# Altium footprint library lib_eps.PcbLib: 113 footprints (part 1 of 8)
Each footprint in its own frame and in the unit in brackets; x right, y up, seen from the top. Pads: shape width x height; smd on the part's side, far side on the other; paste and mask are expansions set on the pad; w line width, h text height; cw(c..) or ccw(c..) is an arc to the next point about the centre after c.
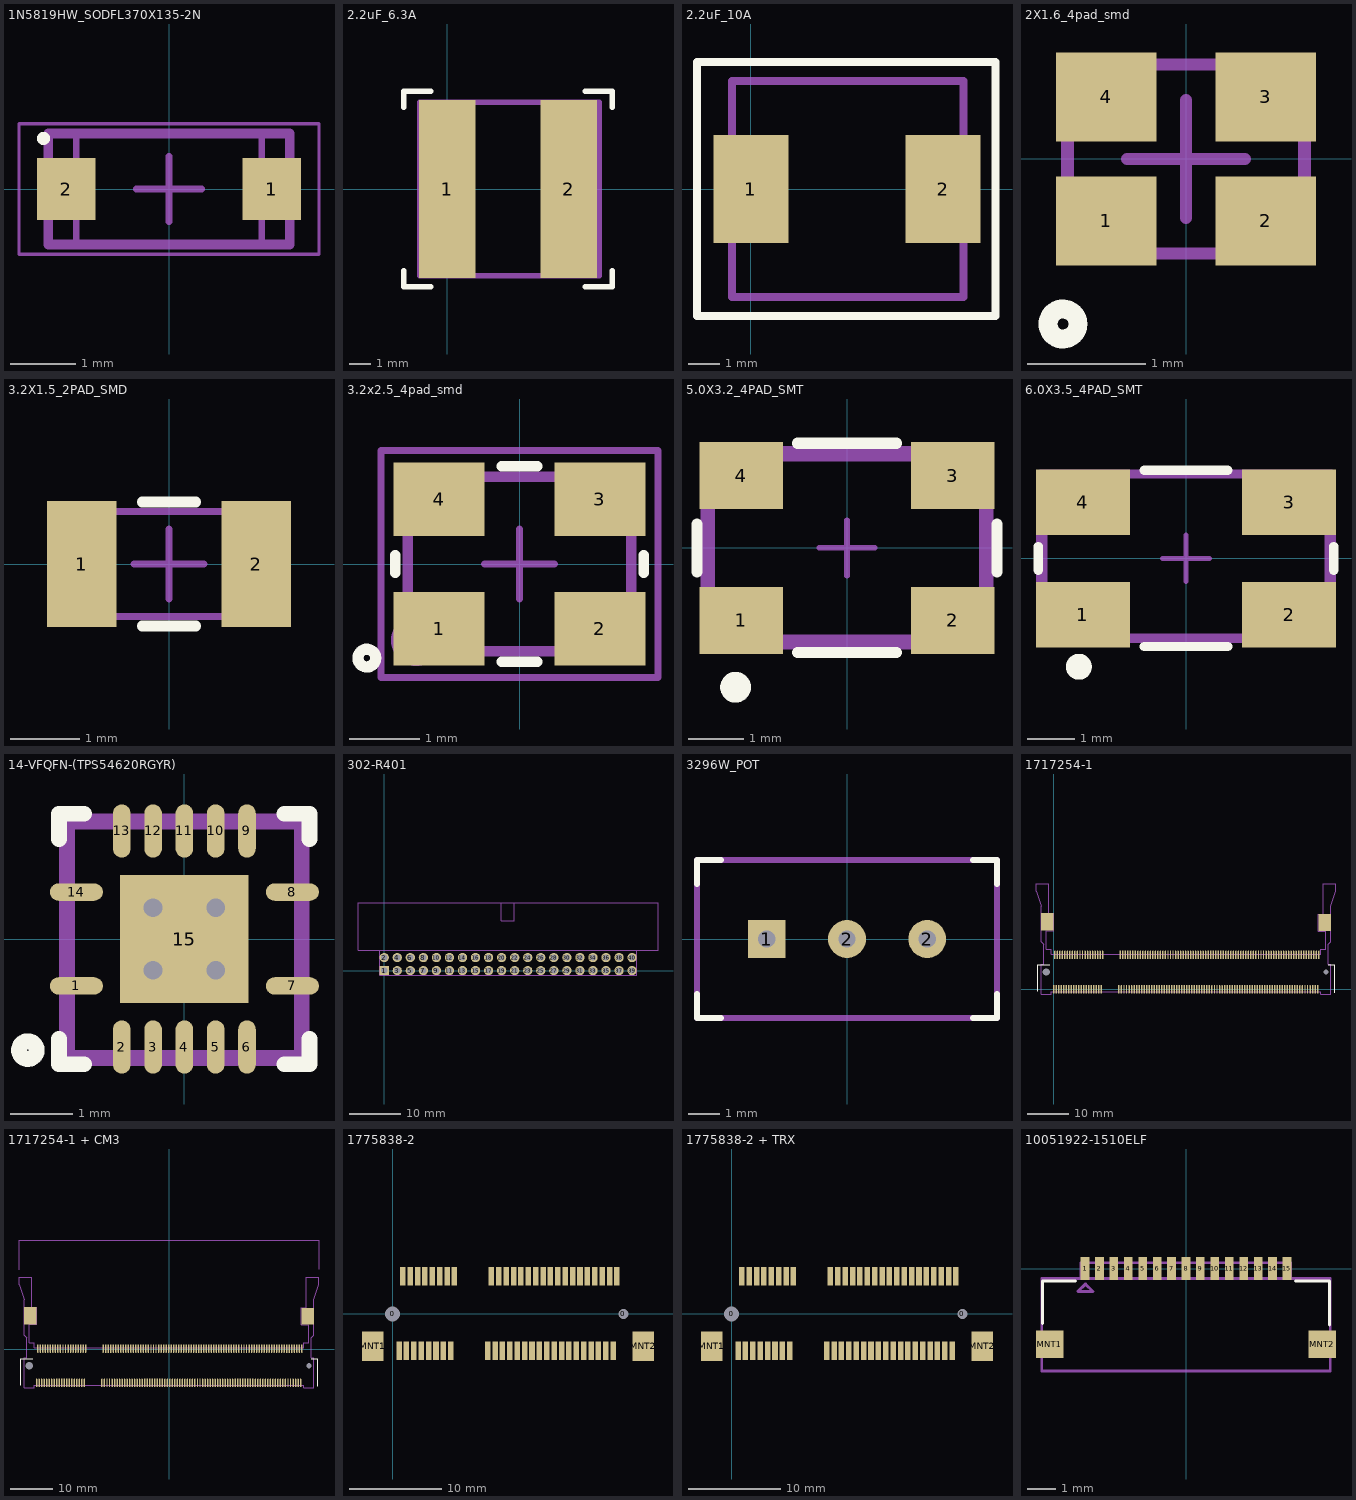
[diagram p0: the footprints below, top view; thin cyan lines are the x and y axes]

## 1N5819HW_SODFL370X135-2N [mm] "SODFL, 2-Leads, Body 1,55x3,70mm, IPC Medium Density"
height 1.35
pads (2):
  rect 0.9x0.95 smd: 1(1.575,0) 2(-1.575,0)
Top Overlay:
  circle w0.1: c-1.925,0.775 r0.05
Mechanical 13:
  lines w0.1: -1.425,-0.85 1.425,-0.85 1.425,0.85 -1.425,0.85 -1.425,-0.85
Mechanical 15:
  lines w0.05: -2.3,-1 2.3,-1 2.3,1 -2.3,1 -2.3,-1
  lines w0.1: -0.5,0 0.5,0 ; 0,-0.5 0,0.5
Mechanical 29:
  lines w0.15: -1.85,-0.85 1.85,-0.85 1.85,0.85 -1.85,0.85 -1.85,-0.85
  text "'.Designator'" at -1.575,-0.25 h0.6
3D body "1N5819HW_SODFL370X135-2N.step": height 1.35, standoff 0, extent -1.85,-0.85 1.85,0.85

## 2.2uF_6.3A [mm] "0.315\" L x 0.315\" W (8.00mm x 8.00mm) 6.3A"
pads (2):
  rect 2.6x8.2 smd paste-5: 1(0,0) 2(5.6,0)
Top Overlay:
  lines w0.254: -2,-3.75 -2,-4 -2,-4.5 -0.75,-4.5 ; -2,3.75 -2,4.5 -0.75,4.5 ; 6.35,-4.5 7.6,-4.5 7.6,-3.75 ; 6.35,4.5 7.6,4.5 7.6,3.75
Top Paste:
  region: 5.8,-2.425 6.8,-2.425 6.8,-4 5.8,-4
  region: 4.4,-2.425 5.4,-2.425 5.4,-4 4.4,-4
  region: 5.8,-0.2 6.8,-0.2 6.8,-1.925 5.8,-1.925
  region: 4.4,-0.2 5.4,-0.2 5.4,-1.925 4.4,-1.925
  region: 5.8,1.925 6.8,1.925 6.8,0.2 5.8,0.2
  region: 4.4,1.925 5.4,1.925 5.4,0.2 4.4,0.2
  region: 5.8,4 6.8,4 6.8,2.425 5.8,2.425
  region: 4.4,4 5.4,4 5.4,2.425 4.4,2.425
  region: -1.2,4 -0.2,4 -0.2,2.425 -1.2,2.425
  region: 0.2,4 1.2,4 1.2,2.425 0.2,2.425
  region: -1.2,1.925 -0.2,1.925 -0.2,0.2 -1.2,0.2
  region: 0.2,1.925 1.2,1.925 1.2,0.2 0.2,0.2
  region: -1.2,-0.2 -0.2,-0.2 -0.2,-1.925 -1.2,-1.925
  region: 0.2,-0.2 1.2,-0.2 1.2,-1.925 0.2,-1.925
  region: -1.2,-2.425 -0.2,-2.425 -0.2,-4 -1.2,-4
  region: 0.2,-2.425 1.2,-2.425 1.2,-4 0.2,-4
Mechanical 29:
  lines w0.254: -1.25,-4 -1.25,4 2,4 7,4 7,-4 -1.25,-4
  text "'.Designator'" at -0.3,-0.5 h1.52
3D body "srn8040.stp": height 4, standoff 0.05, extent -1.275,-3.95 6.875,3.95

## 2.2uF_10A [mm] "0.283\" L x 0.262\" W (7.20mm x 6.65mm) 2.2UH 8A"
pads (2):
  rect 2.35x3.4 smd: 1(0,0) 2(6.05,0)
Top Overlay:
  lines w0.254: -1.7,-4 -1.7,0.5 -1.7,4 7.7,4 7.7,-4 -1.7,-4
Mechanical 29:
  lines w0.254: -0.6,-3.4 -0.6,1.9 -0.6,3.4 6.7,3.4 6.7,-3.4 -0.6,-3.4
  text "'.Designator'" at 0.4,-0.7 h1.52
3D body "ASPI-0630LR.STEP": height 1.35, standoff -1.65, extent -0.575,-3.325 6.625,3.325

## 2X1.6_4pad_smd [mm] "2x1.6mm 4Pad SMD"
pads (4):
  rect 0.85x0.75 smd paste+0: 1(-0.675,-0.525) 2(0.675,-0.525) 3(0.675,0.525) 4(-0.675,0.525)
Top Overlay:
  circle w0.16: c-1.041,-1.397 r0.127
Mechanical 13:
  lines w0.1: -1.009,-0.575 -1,-0.584 cw(c-1.003,-0.8) -0.787,-0.8 0.797,-0.8 cw(c1.013,-0.8) 1.009,-0.584 1.009,0.575 1,0.584 cw(c1.003,0.8) 0.787,0.8 -0.797,0.8 cw(c-1.013,0.8) -1.009,0.584 -1.009,-0.575
Mechanical 15:
  lines w0.1: -0.5,0 0.5,0 ; 0,-0.5 0,0.5
Mechanical 29:
  circle w0.15: c-0.61,-0.406 r0.17
  lines w0.1: -1,-0.8 -1,0.8 1,0.8 1,-0.8 -1,-0.8
  text ".Designator" at -0.8,-0.1 h0.6
3D body: height 0.45, standoff 0.05, extent -0.999,-0.799 0.999,0.799

## 3.2X1.5_2PAD_SMD [mm]
pads (2):
  rect 1x1.8 smd: 1(-1.25,0) 2(1.25,0)
Top Overlay:
  lines w0.152: -0.381,-0.889 0.381,-0.889 ; -0.381,0.889 0.381,0.889
Mechanical 13:
  lines w0.1: -1.601,-0.749 -1.601,0.751 1.599,0.751 1.599,-0.749 -1.601,-0.749
Mechanical 15:
  lines w0.1: -0.5,0 0.5,0 ; 0,-0.5 0,0.5
Mechanical 29:
  lines w0.1: -1.6,-0.75 1.6,-0.75 1.6,0.75 -1.6,0.75 -1.6,-0.75
  text ".Designator" at -1.295,-0.432 h0.8
3D body "ABS07-120.STEP": height 0.89, standoff 0, extent -1.603,-0.752 1.603,0.752

## 3.2x2.5_4pad_smd [mm] "3.2x2.5mm 4Pad SMD"
pads (4):
  rect 1.3x1.05 smd paste+0: 1(-1.15,-0.925) 2(1.15,-0.925) 3(1.15,0.925) 4(-1.15,0.925)
Top Overlay:
  circle w0.16: c-2.184,-1.346 r0.127
  lines w0.15: -1.778,-0.127 -1.778,0.127 ; -0.254,-1.397 0.254,-1.397 ; -0.254,1.397 0.254,1.397 ; 1.778,-0.127 1.778,0.127
Mechanical 13:
  lines w0.15: -1.6,-1.25 1.6,-1.25 1.6,1.25 -1.6,1.25 -1.6,-1.25
Mechanical 15:
  lines w0.05: -1.981,-1.626 -1.981,1.626 1.981,1.626 1.981,-1.626 -1.981,-1.626
  lines w0.1: -0.5,0 0.5,0 ; 0,-0.5 0,0.5
Mechanical 29:
  circle w0.254: c-1.473,-1.092 r0.24
  lines w0.1: -1.981,-1.626 1.981,-1.626 1.981,1.626 -1.981,1.626 -1.981,-1.626
  text ".Designator" at -1.651,-0.152 h0.8
3D body "ABM8.STEP": height 0.8, standoff 0, extent -1.6,-1.244 1.6,1.245

## 5.0X3.2_4PAD_SMT [mm] "5.0mm x 3.2mm Oscillator"
pads (4):
  rect 1.5x1.2 smd paste+0: 1(-1.9,-1.3) 2(1.9,-1.3) 3(1.9,1.3) 4(-1.9,1.3)
Top Overlay:
  circle w0.3: c-2,-2.5 r0.127
  lines w0.2: -2.692,-0.432 -2.692,0.432 ; -0.889,-1.88 0.889,-1.88 ; -0.889,1.88 0.889,1.88 ; 2.692,-0.432 2.692,0.432
Mechanical 13:
  lines w0.1: -2.5,-1.6 -2.5,1.6 2.5,1.6 2.5,-1.6 -2.5,-1.6
Mechanical 15:
  lines w0.1: -0.5,0 0.5,0 ; 0,-0.5 0,0.5
Mechanical 29:
  lines w0.18: -1.588,-1.029 ccw(c-1.8,-1.1) -1.576,-1.1
  lines w0.254: -2.5,-1.7 -2.5,-0.5 -2.5,0.6 -2.5,1.7 2.5,1.7 2.5,-1.7 -2.5,-1.7
  text "'.Designator'" at -1.8,-0.6 h1.52
3D body: height 1.5, standoff 0.05, extent -2.55,-1.65 2.55,1.65

## 6.0X3.5_4PAD_SMT [mm] "6.0mm x 3.5mm Oscillator"
pads (4):
  rect 2x1.4 smd paste+0: 1(-2.2,-1.2) 2(2.2,-1.2) 3(2.2,1.2) 4(-2.2,1.2)
Top Overlay:
  circle w0.3: c-2.286,-2.311 r0.127
  lines w0.2: -3.15,-0.254 -3.15,0.254 ; -0.889,-1.88 0.889,-1.88 ; -0.889,1.88 0.889,1.88 ; 3.15,-0.254 3.15,0.254
Mechanical 13:
  lines w0.1: -3,-1.75 -3,1.75 3,1.75 3,-1.75 -3,-1.75
Mechanical 15:
  lines w0.1: -0.5,0 0.5,0 ; 0,-0.5 0,0.5
Mechanical 29:
  circle w0.18: c-2.4,-1.1 r0.283
  lines w0.2: -3.1,-0.3 -3.1,1.8 3.1,1.8 3.1,-1.7 -3.1,-1.7 -3.1,0
  text "'.Designator'" at -2.7,-0.3 h1.52
3D body: height 1.1, standoff 0.05, extent -2.999,-1.749 2.999,1.749

## 14-VFQFN-(TPS54620RGYR) [mm]
pads (15):
  oval 0.85x0.28 smd mask+0.051: 1(-1.725,-0.75) 7(1.725,-0.75) 8(1.725,0.75) 14(-1.725,0.75)
  oval 0.28x0.85 smd mask+0.051: 2(-1,-1.725) 3(-0.5,-1.725) 4(0,-1.725) 5(0.5,-1.725) 6(1,-1.725) 9(1,1.725) 10(0.5,1.725) 11(0,1.725) 12(-0.5,1.725) 13(-1,1.725)
  rect 2.05x2.05 smd mask+0.051: 15(0,0)
via 0.5,0.5 diameter 0.605 hole 0.3
via -0.5,0.5 diameter 0.605 hole 0.3
via -0.5,-0.5 diameter 0.605 hole 0.3
via 0.5,-0.5 diameter 0.605 hole 0.3
Top Overlay:
  circle w0.254: c-2.5,-1.775 r0.141
  lines w0.254: -2,-1.6 -2,-2 -1.6,-2 ; -2,1.6 -2,2 -1.6,2 ; 1.6,-2 2,-2 2,-1.6 ; 1.6,2 2,2 2,1.6
Mechanical 29:
  lines w0.254: -1.875,-1.9 1.85,-1.9 1.875,-1.875 1.875,-0.025 1.875,1.875 -1.875,1.875 -1.875,-1.9
  text "'.Designator'" at -1.35,-0.625 h1.52
3D body "RGY14_2P05X2P05.step": height 1, standoff 0, extent -1.876,-1.876 1.876,1.876

## 302-R401 [mm] "CONN HEADER R/A 40POS 2.54MM"
height 0.231
pads (40):
  rect 1.8x1.8 hole 1.2: 1(0,0)
  round 1.8 hole 1.2: 2(0,2.54) 3(2.54,0) 4(2.54,2.54) 5(5.08,0) 6(5.08,2.54) 7(7.62,0) 8(7.62,2.54) 9(10.16,0) 10(10.16,2.54) 11(12.7,0) 12(12.7,2.54) 13(15.24,0) 14(15.24,2.54) 15(17.78,0) 16(17.78,2.54) 17(20.32,0) 18(20.32,2.54) 19(22.86,0) 20(22.86,2.54) 21(25.4,0) 22(25.4,2.54) 23(27.94,0) 24(27.94,2.54) 25(30.48,0) 26(30.48,2.54) 27(33.02,0) 28(33.02,2.54) 29(35.56,0) 30(35.56,2.54) 31(38.1,0) 32(38.1,2.54) 33(40.64,0) 34(40.64,2.54) 35(43.18,0) 36(43.18,2.54) 37(45.72,0) 38(45.72,2.54) 39(48.26,0) 40(48.26,2.54)
Mechanical 29:
  lines w0.1: 22.8,13.2 22.8,9.7 25.3,9.7 25.3,13.2 ; -0.9,4 -0.9,-0.9 49.2,-0.9 49.2,4 ; -0.9,4 -5.1,4 -5.1,13.2 53.3,13.2 53.3,4 49.2,4 ; -0.9,4 49.2,4
  text "'.Designator'" at 21,5.8 h2.5
3D body "BH-40R.STEP": height 8.6, standoff -3.3, extent -5.06,-0.35 53.34,13.21

## 3296W_POT [mm] "Rectangular - 0.375\" x 0.190\" Face x 0.395\" H (9.53mm x 4.83mm x 10.03mm)"
pads (3):
  rect 1.2x1.2 hole 0.55: 1(-2.54,0)
  round 1.2 hole 0.55: 2(0,0) 2(2.54,0)
Top Overlay:
  lines w0.2: -4.75,-1.75 -4.75,-2.5 -4,-2.5 ; -4.75,1.75 -4.75,2.5 -4,2.5 ; 4,-2.5 4.75,-2.5 4.75,-1.75 ; 4,2.5 4.75,2.5 4.75,1.75
Mechanical 29:
  lines w0.2: -4.75,-2.5 4.75,-2.5 4.75,2.5 -4.75,2.5 -4.75,-2.5
  text "'.Designator'" at -3.25,-1.75 h0.6
3D body "3296W.stp": height 11.52, standoff -6.43, extent -4.762,-2.425 4.763,2.401

## 1717254-1 [mm] "CONN SKT SODIMM 200POS R/A SMD"
height 5.2
pads (204):
  rrect50% 0x0 hole 1.7 mask+0.052: 0(-1.75,4.1)
  rrect50% 0.35x2 smd mask+0.052: 1(0,0) 2(0.3,8.2) 3(0.6,0) 4(0.9,8.2) 5(1.2,0) 6(1.5,8.2) 7(1.8,0) 8(2.1,8.2) 9(2.4,0) 10(2.7,8.2) 11(3,0) 12(3.3,8.2) 13(3.6,0) 14(3.9,8.2) 15(4.2,0) 16(4.5,8.2) 17(4.8,0) 18(5.1,8.2) 19(5.4,0) 20(5.7,8.2) 21(6,0) 22(6.3,8.2) 23(6.6,0) 24(6.9,8.2) 25(7.2,0) 26(7.5,8.2) 27(7.8,0) 28(8.1,8.2) 29(8.4,0) 30(8.7,8.2) 31(9,0) 32(9.3,8.2) 33(9.6,0) 34(9.9,8.2) 35(10.2,0) 36(10.5,8.2) 37(10.8,0) 38(11.1,8.2) 39(11.4,0) 40(11.7,8.2) 41(15.6,0) 42(15.9,8.2) 43(16.2,0) 44(16.5,8.2) 45(16.8,0) 46(17.1,8.2) 47(17.4,0) 48(17.7,8.2) 49(18,0) 50(18.3,8.2) 51(18.6,0) 52(18.9,8.2) 53(19.2,0) 54(19.5,8.2) 55(19.8,0) 56(20.1,8.2) 57(20.4,0) 58(20.7,8.2) 59(21,0) 60(21.3,8.2) 61(21.6,0) 62(21.9,8.2) 63(22.2,0) 64(22.5,8.2) 65(22.8,0) 66(23.1,8.2) 67(23.4,0) 68(23.7,8.2) 69(24,0) 70(24.3,8.2) 71(24.6,0) 72(24.9,8.2) 73(25.2,0) 74(25.5,8.2) 75(25.8,0) 76(26.1,8.2) 77(26.4,0) 78(26.7,8.2) 79(27,0) 80(27.3,8.2) 81(27.6,0) 82(27.9,8.2) 83(28.2,0) 84(28.5,8.2) 85(28.8,0) 86(29.1,8.2) 87(29.4,0) 88(29.7,8.2) 89(30,0) 90(30.3,8.2) 91(30.6,0) 92(30.9,8.2) 93(31.2,0) 94(31.5,8.2) 95(31.8,0) 96(32.1,8.2) 97(32.4,0) 98(32.7,8.2) 99(33,0) 100(33.3,8.2) 101(33.6,0) 102(33.9,8.2) 103(34.2,0) 104(34.5,8.2) 105(34.8,0) 106(35.1,8.2) 107(35.4,0) 108(35.7,8.2) 109(36,0) 110(36.3,8.2) 111(36.6,0) 112(36.9,8.2) 113(37.2,0) 114(37.5,8.2) 115(37.8,0) 116(38.1,8.2) 117(38.4,0) 118(38.7,8.2) 119(39,0) 120(39.3,8.2) 121(39.6,0) 122(39.9,8.2) 123(40.2,0) 124(40.5,8.2) 125(40.8,0) 126(41.1,8.2) 127(41.4,0) 128(41.7,8.2) 129(42,0) 130(42.3,8.2) 131(42.6,0) 132(42.9,8.2) 133(43.2,0) 134(43.5,8.2) 135(43.8,0) 136(44.1,8.2) 137(44.4,0) 138(44.7,8.2) 139(45,0) 140(45.3,8.2) 141(45.6,0) 142(45.9,8.2) 143(46.2,0) 144(46.5,8.2) 145(46.8,0) 146(47.1,8.2) 147(47.4,0) 148(47.7,8.2) 149(48,0) 150(48.3,8.2) 151(48.6,0) 152(48.9,8.2) 153(49.2,0) 154(49.5,8.2) 155(49.8,0) 156(50.1,8.2) 157(50.4,0) 158(50.7,8.2) 159(51,0) 160(51.3,8.2) 161(51.6,0) 162(51.9,8.2) 163(52.2,0) 164(52.5,8.2) 165(52.8,0) 166(53.1,8.2) 167(53.4,0) 168(53.7,8.2) 169(54,0) 170(54.3,8.2) 171(54.6,0) 172(54.9,8.2) 173(55.2,0) 174(55.5,8.2) 175(55.8,0) 176(56.1,8.2) 177(56.4,0) 178(56.7,8.2) 179(57,0) 180(57.3,8.2) 181(57.6,0) 182(57.9,8.2) 183(58.2,0) 184(58.5,8.2) 185(58.8,0) 186(59.1,8.2) 187(59.4,0) 188(59.7,8.2) 189(60,0) 190(60.3,8.2) 191(60.6,0) 192(60.9,8.2) 193(61.2,0) 194(61.5,8.2) 195(61.8,0) 196(62.1,8.2) 197(62.4,0) 198(62.7,8.2) 199(63,0) 200(63.3,8.2)
  rrect50% 0x0 hole 1.2 mask+0.052: 1(65.05,4.1)
  rect 3x4.2 smd mask+0.052: PAD1(-1.525,16.075)
  rect 3x4 smd mask+0.052: PAD2(64.75,15.925)
Top Overlay:
  lines w0.1: -3.8,-0.5 -3.8,5.8 -0.9,5.8 ; 65.6,5.8 67.1,5.8 67.1,-0.8
Mechanical 29:
  lines w0.1: -4.2,23.4 -4.2,25.2 -1.2,25.2 -1.2,18.1 0,18.1 0,14 -1.8,14 -1.8,9.6 -0.6,9.6 -0.6,8.4 63.8,8.4 63.8,9.6 65,9.6 65,13.9 63.2,13.9 63.2,17.9 64.4,17.9 64.4,25.2 67.4,25.2 67.4,23.4 66.2,19.8 66.2,11.4 65.6,10.8 65.6,6 66.2,6 66.2,-1.2 63.8,-1.2 63.8,-0.6 63.2,-0.6 0,-0.6 -0.6,-0.6 -0.6,-1.2 -3,-1.2 -3,6 -2.4,6 -2.4,10.8 -3,11.4 -3,19.8 -4.2,23.4
  text "'.Designator'" at 25.3,2.8 h2.5
3D body "c-1717254-1-d1-3d.stp": height 5.48, standoff -0.42, extent -4.1,-0.9 67.4,25.14

## 1717254-1 + CM3 [mm] "CONN SKT SODIMM 200POS R/A SMD"
height 5.2
pads (204):
  rrect50% 0x0 hole 1.7 mask+0.052: 0(-33.4,-3.938)
  rrect50% 0.35x2 smd mask+0.052: 1(-31.65,-8.038) 2(-31.35,0.162) 3(-31.05,-8.038) 4(-30.75,0.162) 5(-30.45,-8.038) 6(-30.15,0.162) 7(-29.85,-8.038) 8(-29.55,0.162) 9(-29.25,-8.038) 10(-28.95,0.162) 11(-28.65,-8.038) 12(-28.35,0.162) 13(-28.05,-8.038) 14(-27.75,0.162) 15(-27.45,-8.038) 16(-27.15,0.162) 17(-26.85,-8.038) 18(-26.55,0.162) 19(-26.25,-8.038) 20(-25.95,0.162) 21(-25.65,-8.038) 22(-25.35,0.162) 23(-25.05,-8.038) 24(-24.75,0.162) 25(-24.45,-8.038) 26(-24.15,0.162) 27(-23.85,-8.038) 28(-23.55,0.162) 29(-23.25,-8.038) 30(-22.95,0.162) 31(-22.65,-8.038) 32(-22.35,0.162) 33(-22.05,-8.038) 34(-21.75,0.162) 35(-21.45,-8.038) 36(-21.15,0.162) 37(-20.85,-8.038) 38(-20.55,0.162) 39(-20.25,-8.038) 40(-19.95,0.162) 41(-16.05,-8.038) 42(-15.75,0.162) 43(-15.45,-8.038) 44(-15.15,0.162) 45(-14.85,-8.038) 46(-14.55,0.162) 47(-14.25,-8.038) 48(-13.95,0.162) 49(-13.65,-8.038) 50(-13.35,0.162) 51(-13.05,-8.038) 52(-12.75,0.162) 53(-12.45,-8.038) 54(-12.15,0.162) 55(-11.85,-8.038) 56(-11.55,0.162) 57(-11.25,-8.038) 58(-10.95,0.162) 59(-10.65,-8.038) 60(-10.35,0.162) 61(-10.05,-8.038) 62(-9.75,0.162) 63(-9.45,-8.038) 64(-9.15,0.162) 65(-8.85,-8.038) 66(-8.55,0.162) 67(-8.25,-8.038) 68(-7.95,0.162) 69(-7.65,-8.038) 70(-7.35,0.162) 71(-7.05,-8.038) 72(-6.75,0.162) 73(-6.45,-8.038) 74(-6.15,0.162) 75(-5.85,-8.038) 76(-5.55,0.162) 77(-5.25,-8.038) 78(-4.95,0.162) 79(-4.65,-8.038) 80(-4.35,0.162) 81(-4.05,-8.038) 82(-3.75,0.162) 83(-3.45,-8.038) 84(-3.15,0.162) 85(-2.85,-8.038) 86(-2.55,0.162) 87(-2.25,-8.038) 88(-1.95,0.162) 89(-1.65,-8.038) 90(-1.35,0.162) 91(-1.05,-8.038) 92(-0.75,0.162) 93(-0.45,-8.038) 94(-0.15,0.162) 95(0.15,-8.038) 96(0.45,0.162) 97(0.75,-8.038) 98(1.05,0.162) 99(1.35,-8.038) 100(1.65,0.162) 101(1.95,-8.038) 102(2.25,0.162) 103(2.55,-8.038) 104(2.85,0.162) 105(3.15,-8.038) 106(3.45,0.162) 107(3.75,-8.038) 108(4.05,0.162) 109(4.35,-8.038) 110(4.65,0.162) 111(4.95,-8.038) 112(5.25,0.162) 113(5.55,-8.038) 114(5.85,0.162) 115(6.15,-8.038) 116(6.45,0.162) 117(6.75,-8.038) 118(7.05,0.162) 119(7.35,-8.038) 120(7.65,0.162) 121(7.95,-8.038) 122(8.25,0.162) 123(8.55,-8.038) 124(8.85,0.162) 125(9.15,-8.038) 126(9.45,0.162) 127(9.75,-8.038) 128(10.05,0.162) 129(10.35,-8.038) 130(10.65,0.162) 131(10.95,-8.038) 132(11.25,0.162) 133(11.55,-8.038) 134(11.85,0.162) 135(12.15,-8.038) 136(12.45,0.162) 137(12.75,-8.038) 138(13.05,0.162) 139(13.35,-8.038) 140(13.65,0.162) 141(13.95,-8.038) 142(14.25,0.162) 143(14.55,-8.038) 144(14.85,0.162) 145(15.15,-8.038) 146(15.45,0.162) 147(15.75,-8.038) 148(16.05,0.162) 149(16.35,-8.038) 150(16.65,0.162) 151(16.95,-8.038) 152(17.25,0.162) 153(17.55,-8.038) 154(17.85,0.162) 155(18.15,-8.038) 156(18.45,0.162) 157(18.75,-8.038) 158(19.05,0.162) 159(19.35,-8.038) 160(19.65,0.162) 161(19.95,-8.038) 162(20.25,0.162) 163(20.55,-8.038) 164(20.85,0.162) 165(21.15,-8.038) 166(21.45,0.162) 167(21.75,-8.038) 168(22.05,0.162) 169(22.35,-8.038) 170(22.65,0.162) 171(22.95,-8.038) 172(23.25,0.162) 173(23.55,-8.038) 174(23.85,0.162) 175(24.15,-8.038) 176(24.45,0.162) 177(24.75,-8.038) 178(25.05,0.162) 179(25.35,-8.038) 180(25.65,0.162) 181(25.95,-8.038) 182(26.25,0.162) 183(26.55,-8.038) 184(26.85,0.162) 185(27.15,-8.038) 186(27.45,0.162) 187(27.75,-8.038) 188(28.05,0.162) 189(28.35,-8.038) 190(28.65,0.162) 191(28.95,-8.038) 192(29.25,0.162) 193(29.55,-8.038) 194(29.85,0.162) 195(30.15,-8.038) 196(30.45,0.162) 197(30.75,-8.038) 198(31.05,0.162) 199(31.35,-8.038) 200(31.65,0.162)
  rrect50% 0x0 hole 1.2 mask+0.052: 1(33.4,-3.938)
  rect 3x4.2 smd mask+0.052: PAD1(-33.175,8.038)
  rect 3x4 smd mask+0.052: PAD2(33.1,7.887)
Top Overlay:
  lines w0.1: -35.45,-8.538 -35.45,-2.238 -32.55,-2.238 ; 33.95,-2.238 35.45,-2.238 35.45,-8.838
Mechanical 29:
  lines w0.1: -35.75,18.962 -35.75,26.062 35.75,26.062 35.75,19.062 ; -35.85,15.362 -34.65,11.762 -34.65,3.362 -34.05,2.762 -34.05,-2.038 -34.65,-2.038 -34.65,-9.238 -32.25,-9.238 -32.25,-8.638 -31.65,-8.638 31.55,-8.638 32.15,-8.638 32.15,-9.238 34.55,-9.238 34.55,-2.038 33.95,-2.038 33.95,2.762 34.55,3.362 34.55,11.762 35.75,15.362 35.75,17.162 32.75,17.162 32.75,9.862 31.55,9.862 31.55,5.862 33.35,5.862 33.35,1.562 32.15,1.562 32.15,0.362 -32.25,0.362 -32.25,1.562 -33.45,1.562 -33.45,5.962 -31.65,5.962 -31.65,10.062 -32.85,10.062 -32.85,17.162 -35.85,17.162 -35.85,15.362
  text "'.Designator'" at -6.35,-5.238 h2.5
3D body "Raspberry CM3 with Socket.stp": height 5.24, standoff -0.66, extent -35.75,-8.938 35.75,26.062

## 1775838-2 [mm] "CONN PCI EXP MINI FEMALE 52POS"
height 5.6
pads (56):
  rect 1x1 hole 1.6 unplated: 0(0,0)
  round 1 hole 1.1 unplated mask+0.051: 0(25,0)
  rect 0.6x2 smd mask+0.051: 1(0.7,-4) 2(1.1,4.1) 3(1.5,-4) 4(1.9,4.1) 5(2.3,-4) 6(2.7,4.1) 7(3.1,-4) 8(3.5,4.1) 9(3.9,-4) 10(4.3,4.1) 11(4.7,-4) 12(5.1,4.1) 13(5.5,-4) 14(5.9,4.1) 15(6.3,-4) 16(6.7,4.1) 17(10.3,-4) 18(10.7,4.1) 19(11.1,-4) 20(11.5,4.1) 21(11.9,-4) 22(12.3,4.1) 23(12.7,-4) 24(13.1,4.1) 25(13.5,-4) 26(13.9,4.1) 27(14.3,-4) 28(14.7,4.1) 29(15.1,-4) 30(15.5,4.1) 31(15.9,-4) 32(16.3,4.1) 33(16.7,-4) 34(17.1,4.1) 35(17.5,-4) 36(17.9,4.1) 37(18.3,-4) 38(18.7,4.1) 39(19.1,-4) 40(19.5,4.1) 41(19.9,-4) 42(20.3,4.1) 43(20.7,-4) 44(21.1,4.1) 45(21.5,-4) 46(21.9,4.1) 47(22.3,-4) 48(22.7,4.1) 49(23.1,-4) 50(23.5,4.1) 51(23.9,-4) 52(24.3,4.1)
  rect 2.3x3.2 smd: MNT1(-2.15,-3.5) MNT2(27.15,-3.5)
3D body "c-1775838-2-g-3d.stp": height 5.58, standoff -0.67, extent -2.425,-4.59 27.475,4.49

## 1775838-2 + TRX [mm] "CONN PCI EXP MINI FEMALE 52POS"
height 5.6
pads (56):
  rect 1x1 hole 1.6 unplated: 0(0,0)
  round 1 hole 1.1 unplated mask+0.051: 0(25,0)
  rect 0.6x2 smd mask+0.051: 1(0.7,-4) 2(1.1,4.1) 3(1.5,-4) 4(1.9,4.1) 5(2.3,-4) 6(2.7,4.1) 7(3.1,-4) 8(3.5,4.1) 9(3.9,-4) 10(4.3,4.1) 11(4.7,-4) 12(5.1,4.1) 13(5.5,-4) 14(5.9,4.1) 15(6.3,-4) 16(6.7,4.1) 17(10.3,-4) 18(10.7,4.1) 19(11.1,-4) 20(11.5,4.1) 21(11.9,-4) 22(12.3,4.1) 23(12.7,-4) 24(13.1,4.1) 25(13.5,-4) 26(13.9,4.1) 27(14.3,-4) 28(14.7,4.1) 29(15.1,-4) 30(15.5,4.1) 31(15.9,-4) 32(16.3,4.1) 33(16.7,-4) 34(17.1,4.1) 35(17.5,-4) 36(17.9,4.1) 37(18.3,-4) 38(18.7,4.1) 39(19.1,-4) 40(19.5,4.1) 41(19.9,-4) 42(20.3,4.1) 43(20.7,-4) 44(21.1,4.1) 45(21.5,-4) 46(21.9,4.1) 47(22.3,-4) 48(22.7,4.1) 49(23.1,-4) 50(23.5,4.1) 51(23.9,-4) 52(24.3,4.1)
  rect 2.3x3.2 smd: MNT1(-2.15,-3.5) MNT2(27.15,-3.5)
3D body "TRX + miniPCI.stp": height 5.56, standoff -0.69, extent -2.45,-4.58 27.45,50.9

## 10051922-1510ELF [mm] "CONN FPC BOTTOM 15POS 0.50MM R/A"
height 1.3
pads (17):
  rect 0.3x0.8 smd mask+0.051: 1(-3.5,0) 2(-3,0) 3(-2.5,0) 4(-2,0) 5(-1.5,0) 6(-1,0) 7(-0.5,0) 8(0,0) 9(0.5,0) 10(1,0) 11(1.5,0) 12(2,0) 13(2.5,0) 14(3,0) 15(3.5,0)
  rect 0.95x0.95 smd: MNT1(-4.725,-2.625) MNT2(4.725,-2.625)
Top Overlay:
  lines w0.1: -4.975,-1.9 -4.975,-0.425 -3.825,-0.425 ; 3.8,-0.425 4.975,-0.425 4.975,-1.95
Mechanical 29:
  lines w0.1: -3.65,-0.35 -3.65,0.2 3.625,0.2 3.625,-0.35 ; -3.475,-0.55 -3.225,-0.8 -3.75,-0.8 -3.475,-0.525 ; -5,-3.55 -5,-0.35 5,-0.35 5,-3.55 -5,-3.55
  text "'.Designator'" at -1.225,-2.425 h1
3D body "s10051922_1510elf.stp": height 1.27, standoff -0.03, extent -5,-3.55 5,0.2